# Altium footprint library Semicon-Discrete.pcblib: 205 footprints (part 6 of 13)
Each footprint in its own frame and in the unit in brackets; x right, y up, seen from the top. Pads: shape width x height; smd on the part's side, far side on the other; paste and mask are expansions set on the pad; w line width, h text height; cw(c..) or ccw(c..) is an arc to the next point about the centre after c.
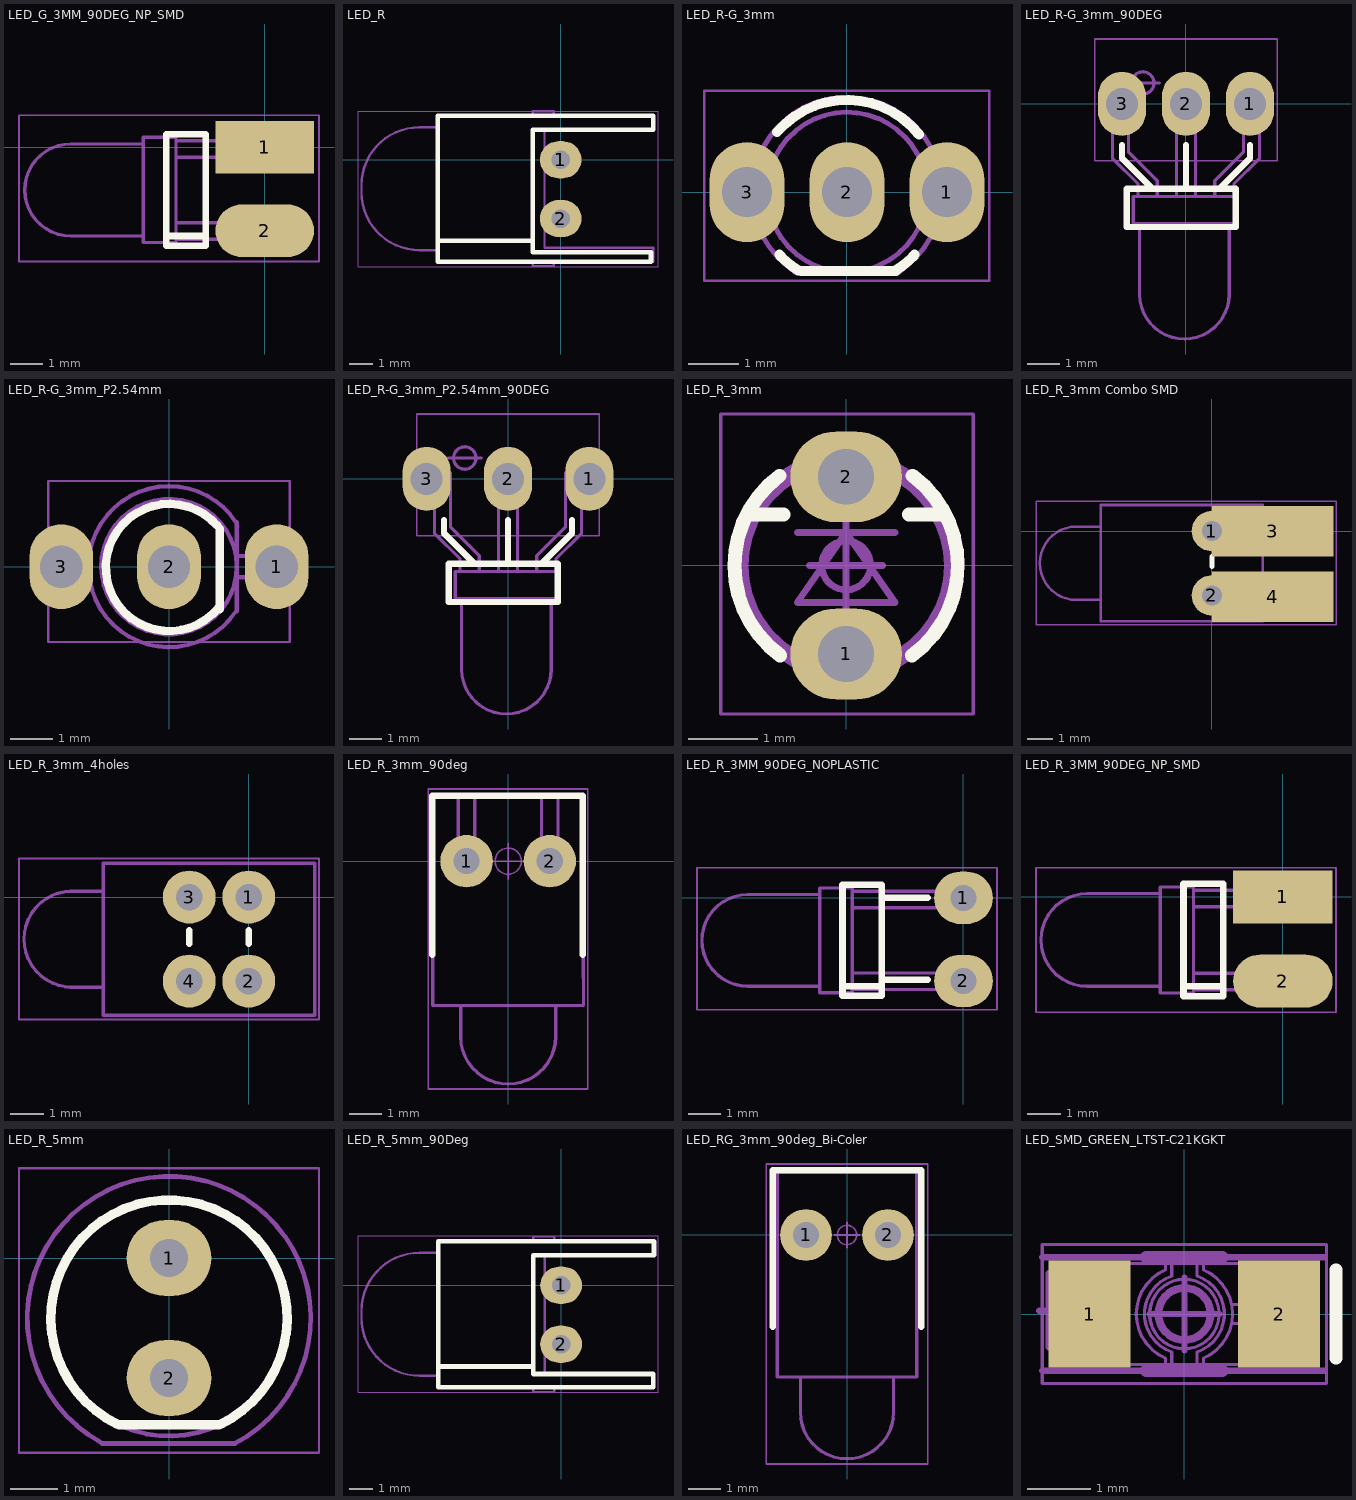
[diagram p5: the footprints below, top view; thin cyan lines are the x and y axes]

## LED_G_3MM_90DEG_NP_SMD [mm]
pads (2):
  rect 3x1.6 smd: 1(0,0)
  oval 3x1.6 smd: 2(0,-2.54)
TopOverlay:
  lines w0.2: -3,-2.7 -1.8,-2.7 ; -3,-3 -1.8,-3 -1.8,0 -1.8,0.4 -3,0.4 -3,-3
2-TopCompOutl:
  lines w0.1: -3.7,-2.7 -5.9,-2.7 cw(c-5.9,-1.3) -5.9,0.1 -3.7,0.1 -3.7,0.3 -2.7,0.3 -2.7,-2.9 -3.7,-2.9 -3.7,0.2 ; -2.7,-2.8 0.7,-2.8 0.7,-2.3 -2.7,-2.3 ; -2.7,-0.3 0.7,-0.3 0.7,0.2 -2.7,0.2
4-TopCourty:
  circle w0.1: c0,0 r0.325
  lines w0.05: -7.475,-3.475 1.65,-3.475 1.65,0.975 -7.475,0.975 -7.475,-3.475
  lines w0.1: -0.525,0 0.525,0 ; 0,-0.525 0,0.525
7-TopAssy:
  lines w0.1: -3.7,-2.7 -5.9,-2.7 cw(c-5.9,-1.3) -5.9,0.1 -3.7,0.1 -3.7,0.3 -2.7,0.3 -2.7,-2.9 -3.7,-2.9 -3.7,0.2 ; -2.7,-2.8 0.7,-2.8 0.7,-2.3 -2.7,-2.3 ; -2.7,-0.3 0.7,-0.3 0.7,0.2 -2.7,0.2
  text ".Designator" at -5.925,0.9 h2.2

## LED_R [mm]
pads (2):
  oval 1.8x1.6 hole 0.8: 1(0,0) 2(0,-2.54)
TopOverlay:
  lines w0.2: -5.3,-3.5 -1.2,-3.5 ; -5.3,-4.4 -5.3,1.9 -5.2,1.9 4,1.9 4,1.3 -1.2,1.3 -1.2,-4 3.9,-4 3.9,-4.4 -5.3,-4.4
2-TopCompOutl:
  lines w0.1: -8.6,-1.5 -8.6,-1 ; -8.6,-1.4 ccw(c-6.1,-1.4) -6.1,-3.9 -5.3,-3.9 ; -8.6,-1.1 cw(c-6.1,-1.1) -6.1,1.4 -5.3,1.4 ; -1.2,-4.4 -1.2,-4.6 -0.3,-4.6 -0.3,-4.4 ; -1.2,1.9 -1.2,2.1 -0.3,2.1 -0.3,1.9 ; -5.3,-4.4 4,-4.4 4,-3.8 -0.7,-3.8 -0.7,1.3 4,1.3 4,1.9 -5.3,1.9 -5.3,0 -5.3,-4.4
4-TopCourty:
  circle w0.1: c0,0 r0.35
  lines w0.05: -8.75,-4.625 4.2,-4.625 4.2,2.1 -8.75,2.1 -8.75,-4.625
  lines w0.1: -0.525,0 0.525,0 ; 0,-0.525 0,0.525
7-TopAssy:
  lines w0.1: -8.6,-1.5 -8.6,-1 ; -8.6,-1.4 ccw(c-6.1,-1.4) -6.1,-3.9 -5.3,-3.9 ; -8.6,-1.1 cw(c-6.1,-1.1) -6.1,1.4 -5.3,1.4 ; -1.2,-4.4 -1.2,-4.6 -0.3,-4.6 -0.3,-4.4 ; -1.2,1.9 -1.2,2.1 -0.3,2.1 -0.3,1.9 ; -5.3,-4.4 -5.3,0 -5.3,1.9 4,1.9 4,1.3 -0.7,1.3 -0.7,-3.8 4,-3.8 4,-4.4 -5.3,-4.4
  text ".Designator" at -6.25,2.525 h2.2

## LED_R-G_3mm [mm]
pads (3):
  oval 1.5x2 hole 1: 1(2,0) 2(0,0) 3(-2,0)
TopOverlay:
  lines w0.2: -1.4,1.2 cw(c0,0) 1.44,1.152 ; -1.355,-1.251 ccw(c0,0) -0.977,-1.564 ; -0.925,-1.575 0.975,-1.575 ; 0.977,-1.564 ccw(c0,0) 1.355,-1.251
2-TopCompOutl:
  lines w0.1: -1.9,-0.25 -2.25,-0.25 -2.25,0 -2.25,0.25 -1.9,0.25 ; -1.054,-1.581 cw(c0,0) 1.036,-1.592 ; -1.05,-1.6 1.05,-1.6 ; 0,-1.6 cw(c0,0) 0.028,-1.6 ; 1.9,-0.25 2.25,-0.25 2.25,0 2.25,0.25 1.9,0.25
4-TopCourty:
  circle w0.1: c0,0 r0.35
  lines w0.05: -2.85,-1.775 2.85,-1.775 2.85,2.025 -2.85,2.025 -2.85,-1.775
  lines w0.1: -0.525,0 0.525,0 ; 0,-0.525 0,0.525
7-TopAssy:
  lines w0.1: -1.9,-0.25 -2.25,-0.25 -2.25,0 -2.25,0.25 -1.9,0.25 ; -1.054,-1.581 cw(c0,0) 1.036,-1.592 ; -1.05,-1.6 1.05,-1.6 ; 0,-1.6 cw(c0,0) 0.028,-1.6 ; 1.9,-0.25 2.25,-0.25 2.25,0 2.25,0.25 1.9,0.25
  text ".Designator" at -1.375,2.225 h2.2
3D body "LED_R-G_3mm.STEP": height 9, standoff -2.2, extent -2.25,-1.55 2.25,1.9

## LED_R-G_3mm_90DEG [mm]
pads (3):
  oval 1.5x2 hole 1: 1(2,0) 2(0,0) 3(-2,0)
TopOverlay:
  lines w0.2: -2,-1.3 -2,-1.7 -1.1,-2.6 ; -1.45,-2.65 1.55,-2.65 1.55,-3.85 -1.85,-3.85 -1.85,-2.65 -1.4,-2.65 ; 0,-2.6 0,-1.3 ; 1.1,-2.6 2,-1.7 2,-1.3
2-TopCompOutl:
  lines w0.1: -1.55,-3.75 1.6,-3.75 1.6,-2.9 -1.65,-2.9 -1.65,-3.75 -1.45,-3.75 -1.45,-5.95 ccw(c-0.05,-5.95) 1.35,-5.95 1.35,-3.75 ; -1.5,-2.9 -1.5,-2.5 -2.3,-1.7 -2.3,0.2 -1.8,0.2 -1.8,-1.5 -0.9,-2.4 -0.9,-2.5 -0.9,-2.9 ; -0.3,-2.9 -0.3,0.2 0.3,0.2 0.3,-2.8 0.3,-2.9 ; 0.9,-2.9 0.9,-2.5 0.9,-2.4 1.8,-1.5 1.8,0.2 2.3,0.2 2.3,-1.7 1.5,-2.5 1.5,-2.9
4-TopCourty:
  circle w0.1: c-1.35,0.65 r0.35
  circle w0.1: c0,0 r0.35
  lines w0.05: -2.85,-1.775 -2.85,2.025 2.85,2.025 2.85,-1.775 -2.85,-1.775
  lines w0.1: -1.875,0.65 -0.825,0.65 ; -0.525,0 0.525,0 ; 0,-0.525 0,0.525
7-TopAssy:
  lines w0.1: -1.55,-3.75 1.6,-3.75 1.6,-2.9 -1.65,-2.9 -1.65,-3.75 -1.45,-3.75 -1.45,-5.95 ccw(c-0.05,-5.95) 1.35,-5.95 1.35,-3.75 ; -1.5,-2.9 -1.5,-2.5 -2.3,-1.7 -2.3,0.2 -1.8,0.2 -1.8,-1.5 -0.9,-2.4 -0.9,-2.5 -0.9,-2.9 ; -0.3,-2.9 -0.3,0.2 0.3,0.2 0.3,-2.8 0.3,-2.9 ; 0.9,-2.9 0.9,-2.5 0.9,-2.4 1.8,-1.5 1.8,0.2 2.3,0.2 2.3,-1.7 1.5,-2.5 1.5,-2.9
  text ".Designator" at 0.6,-7.1 h2.2
3D body "LED_R-G_3mm_90DEG.STEP": height 4.9, standoff -2, extent -2.25,-7.5 2.25,0.25

## LED_R-G_3mm_P2.54mm [mm]
pads (3):
  oval 1.5x2 hole 1: 1(2.54,0) 2(0,0) 3(-2.54,0)
TopOverlay:
  lines w0.2: 1.134,0.972 ccw(c0.009,-0.02) 1.168,-0.973 ; 1.2,-1 1.2,0.9
2-TopCompOutl:
  lines w0.1: -1.9,-0.25 -2.25,-0.25 -2.25,0 -2.25,0.25 -1.9,0.25 ; 1.581,-1.054 cw(c0,0) 1.592,1.036 ; 1.6,-1.05 1.6,1.05 ; 1.6,-0.225 1.6,-0.25 1.9,-0.25 2.25,-0.25 2.25,0 2.25,0.25 1.9,0.25 1.6,0.25 ; 1.6,0 cw(c0,0) 1.6,0.028
4-TopCourty:
  circle w0.1: c0,0 r0.35
  lines w0.05: -2.85,-1.775 -2.85,2.025 2.85,2.025 2.85,-1.775 -2.85,-1.775
  lines w0.1: -0.525,0 0.525,0 ; 0,-0.525 0,0.525
7-TopAssy:
  lines w0.1: -1.9,-0.25 -2.25,-0.25 -2.25,0 -2.25,0.25 -1.9,0.25 ; 1.581,-1.054 cw(c0,0) 1.592,1.036 ; 1.6,-1.05 1.6,1.05 ; 1.6,0 cw(c0,0) 1.6,0.028 ; 1.625,-0.25 1.9,-0.25 2.25,-0.25 2.25,0 2.25,0.25 1.9,0.25 1.625,0.25
  text ".Designator" at -1.375,2.225 h2.2
3D body "LED_R-G_3mm_P2.54mm.STEP": height 9, standoff -2.2, extent -2.79,-1.9 2.79,1.9

## LED_R-G_3mm_P2.54mm_90DEG [mm]
pads (3):
  oval 1.5x2 hole 1: 1(2.54,0) 2(0,0) 3(-2.54,0)
TopOverlay:
  lines w0.2: -2,-1.3 -2,-1.7 -1.1,-2.6 ; -1.45,-2.65 1.55,-2.65 1.55,-3.85 -1.85,-3.85 -1.85,-2.65 -1.4,-2.65 ; 0,-2.6 0,-1.3 ; 1.1,-2.6 2,-1.7 2,-1.3
2-TopCompOutl:
  lines w0.1: -1.55,-3.75 1.6,-3.75 1.6,-2.9 -1.65,-2.9 -1.65,-3.75 -1.45,-3.75 -1.45,-5.95 ccw(c-0.05,-5.95) 1.35,-5.95 1.35,-3.75 ; -1.5,-2.9 -1.5,-2.5 -2.3,-1.7 -2.3,0.2 -1.8,0.2 -1.8,-1.5 -0.9,-2.4 -0.9,-2.5 -0.9,-2.9 ; -0.3,-2.9 -0.3,0.2 0.3,0.2 0.3,-2.8 0.3,-2.9 ; 0.9,-2.9 0.9,-2.5 0.9,-2.4 1.8,-1.5 1.8,0.2 2.3,0.2 2.3,-1.7 1.5,-2.5 1.5,-2.9
4-TopCourty:
  circle w0.1: c0,0 r0.35
  circle w0.1: c-1.35,0.65 r0.35
  lines w0.05: -2.85,-1.775 2.85,-1.775 2.85,2.025 -2.85,2.025 -2.85,-1.775
  lines w0.1: -1.875,0.65 -0.825,0.65 ; -0.525,0 0.525,0 ; 0,-0.525 0,0.525
7-TopAssy:
  lines w0.1: -1.55,-3.75 1.6,-3.75 1.6,-2.9 -1.65,-2.9 -1.65,-3.75 -1.45,-3.75 -1.45,-5.95 ccw(c-0.05,-5.95) 1.35,-5.95 1.35,-3.75 ; -1.5,-2.9 -1.5,-2.5 -2.3,-1.7 -2.3,0.2 -1.8,0.2 -1.8,-1.5 -0.9,-2.4 -0.9,-2.5 -0.9,-2.9 ; -0.3,-2.9 -0.3,0.2 0.3,0.2 0.3,-2.8 0.3,-2.9 ; 0.9,-2.9 0.9,-2.5 0.9,-2.4 1.8,-1.5 1.8,0.2 2.3,0.2 2.3,-1.7 1.5,-2.5 1.5,-2.9
  text ".Designator" at 0.6,-7.1 h2.2
3D body "LED_R-G_3mm_P2.54mm_90DEG.STEP": height 8.15, standoff -2, extent -2.79,-7.5 2.79,0.25

## LED_R_3mm [mm]
pads (2):
  oval 1.6x1.3 hole 0.8: 1(0,-1.27) 2(0,1.27)
TopOverlay:
  lines w0.2: -1.4,0.73 -0.9,0.73 ; -0.954,1.285 ccw(c0,0) -0.945,-1.291 ; 0.9,0.73 1.4,0.73 ; 0.945,-1.291 ccw(c0,0) 0.954,1.285
2-TopCompOutl:
  lines w0.1: -0.528,-1.404 cw(c0,0) 0.528,-1.404 ; -0.525,-1.405 0.525,-1.405
4-TopCourty:
  circle w0.1: c0,0 r0.35
  lines w0.05: -1.8,-2.13 -1.8,2.17 1.825,2.17 1.825,-2.13 -1.8,-2.13
  lines w0.1: -0.525,0 0.525,0 ; 0,-0.525 0,0.525
5-MCadOutl:
  lines w0.05: -0.3,0 0,0 ; 0,-0.229 0,0 ; 0,0.254 0,0 ; 0.3,0 0,0
7-TopAssy:
  circle w0.1: c0,-0.005 r1.45
  lines w0.1: -0.7,0.47 0.7,0.47 ; -0.563,-1.498 cw(c0,0) 0.563,-1.498 ; -0.55,-1.505 0.55,-1.505 ; 0,-0.83 0,0.87 ; -0.7,-0.53 0.7,-0.53 0,0.47 -0.7,-0.53 ; -0.25,-1.53 0.25,-1.53 0.25,-1.03 -0.25,-1.03 -0.25,-1.53 ; -0.25,1.02 -0.25,1.52 0.25,1.52 0.25,1.02 -0.25,1.02
  text ".Designator" at -1.175,2.395 h2.2
3D body "LED_R_3mm.STEP": height 14.5, standoff -3.2, extent -1.596,-1.67 1.6,1.669

## LED_R_3mm Combo SMD [mm]
height 3
pads (4):
  round 1.6 hole 0.8: 1(0,0) 2(0,-2.54)
  rect 4.8x2 smd: 3(2.4,0) 4(2.4,-2.6)
TopOverlay:
  lines w0.2: 0,-1.4 0,-1
2-TopCompOutl:
  lines w0.1: -5.4,-2.72 -4.4,-2.72 ; -5.4,0.18 -4.4,0.18 ; -5.35,-2.72 cw(c-5.35,-1.27) -5.35,0.18 ; 2,-2.8 4.5,-2.8 4.5,-2.2 2,-2.2 ; 2,-0.3 4.5,-0.3 4.5,0.3 2,0.3 ; -4.4,-3.57 -4.4,1.03 2,1.03 2,-3.57 -4.4,-3.57
4-TopCourty:
  circle w0.1: c0,0 r0.4
  lines w0.05: -6.95,-3.7 4.9,-3.7 4.9,1.17 -6.95,1.17 -6.95,-3.7
  lines w0.1: -0.55,0 0.55,0 ; 0,-0.575 0,0.575
7-TopAssy:
  lines w0.1: -5.4,-2.72 -4.4,-2.72 ; -5.4,0.18 -4.4,0.18 ; -5.35,-2.72 cw(c-5.35,-1.27) -5.35,0.18 ; 2,-2.8 4.5,-2.8 4.5,-2.2 2,-2.2 ; 2,-0.3 4.5,-0.3 4.5,0.3 2,0.3 ; -4.4,-3.57 2,-3.57 2,1.03 -4.4,1.03 -4.4,-3.57
  text ".Designator" at -4.375,1.425 h2.2

## LED_R_3mm_4holes [mm]
pads (4):
  round 1.6 hole 0.8: 1(0,0) 2(0,-2.54) 3(-1.8,0) 4(-1.8,-2.54)
TopOverlay:
  lines w0.2: -1.8,-1.4 -1.8,-1 ; 0,-1.4 0,-1
2-TopCompOutl:
  lines w0.1: -5.4,-2.72 -4.4,-2.72 ; -5.4,0.18 -4.4,0.18 ; -5.35,-2.72 cw(c-5.35,-1.27) -5.35,0.18 ; -4.4,-3.57 2,-3.57 2,1.03 -4.4,1.03 -4.4,-3.57
4-TopCourty:
  circle w0.1: c0,0 r0.4
  lines w0.05: -6.95,-3.7 -6.95,1.17 2.125,1.17 2.125,-3.7 -6.95,-3.7
  lines w0.1: -0.55,0 0.55,0 ; 0,-0.575 0,0.575
7-TopAssy:
  lines w0.1: -5.4,-2.72 -4.4,-2.72 ; -5.4,0.18 -4.4,0.18 ; -5.35,-2.72 cw(c-5.35,-1.27) -5.35,0.18 ; -4.4,-3.57 -4.4,1.03 2,1.03 2,-3.57 -4.4,-3.57
  text ".Designator" at -5.05,1.625 h2.2

## LED_R_3mm_90deg [mm]
height 5.04
pads (2):
  round 1.6 hole 0.8: 1(-1.27,0) 2(1.27,0)
TopOverlay:
  lines w0.2: -2.32,-2.85 -2.32,2 2.28,2 2.28,-2.85
2-TopCompOutl:
  drawing of 295 lines, arcs and shapes, not listed
4-TopCourty:
  circle w0.05: c0,0 r0.4
  lines w0.05: -0.575,0 0.575,0 ; 0,-0.55 0,0.55 ; -2.44,-6.95 2.43,-6.95 2.43,2.2 -2.44,2.2 -2.44,-6.95
7-TopAssy:
  lines w0.1: -1.45,-5.4 -1.45,-4.4 ; -1.45,-5.35 ccw(c0,-5.35) 1.45,-5.35 ; 1.45,-5.4 1.45,-4.4 ; -2.3,-4.4 -2.3,2 2.3,2 2.3,-4.4 -2.3,-4.4
  text ".Designator" at 0.53,-3.45 h2.2
3D body "LED_R_3mm_90deg.STEP": height 7.3, standoff -3.5, extent -2.3,-6.8 2.3,1.95

## LED_R_3MM_90DEG_NOPLASTIC [mm]
pads (2):
  oval 1.8x1.6 hole 0.8: 1(0,0) 2(0,-2.54)
TopOverlay:
  lines w0.2: -3.7,-2.7 -2.5,-2.7 ; -2.5,-2.5 -1.1,-2.5 ; -1.1,0 -2.5,0 ; -2.5,0 -2.5,-3 -3.7,-3 -3.7,0.4 -2.5,0.4 -2.5,0
2-TopCompOutl:
  lines w0.1: -4.4,-2.7 -6.6,-2.7 cw(c-6.6,-1.3) -6.6,0.1 -4.4,0.1 -4.4,0.3 -3.4,0.3 -3.4,-2.9 -4.4,-2.9 -4.4,0.2 ; -3.4,-2.8 0,-2.8 0,-2.3 -3.4,-2.3 ; -3.4,-0.3 0,-0.3 0,0.2 -3.4,0.2
4-TopCourty:
  circle w0.1: c0,0 r0.4
  lines w0.05: -8.15,-3.425 1.025,-3.425 1.025,0.925 -8.15,0.925 -8.15,-3.425
  lines w0.1: -0.55,0 0.55,0 ; 0,-0.575 0,0.575
7-TopAssy:
  lines w0.1: -4.4,-2.7 -6.6,-2.7 cw(c-6.6,-1.3) -6.6,0.1 -4.4,0.1 -4.4,0.3 -3.4,0.3 -3.4,-2.9 -4.4,-2.9 -4.4,0.2 ; -3.4,-2.8 0,-2.8 0,-2.3 -3.4,-2.3 ; -3.4,-0.3 0,-0.3 0,0.2 -3.4,0.2
  text ".Designator" at -6.45,1.05 h2.2
3D body "LED_R_3MM_90DEG_NOPLASTIC.STEP": height 2, standoff -2.2, extent -7.9,-2.875 0.25,0.325

## LED_R_3MM_90DEG_NP_SMD [mm]
height 3
pads (2):
  rect 3x1.6 smd: 1(0,0)
  oval 3x1.6 smd: 2(0,-2.54)
TopOverlay:
  lines w0.2: -3,-2.7 -1.8,-2.7 ; -3,-3 -1.8,-3 -1.8,0 -1.8,0.4 -3,0.4 -3,-3
2-TopCompOutl:
  lines w0.1: -3.7,-2.7 -5.9,-2.7 cw(c-5.9,-1.3) -5.9,0.1 -3.7,0.1 -3.7,0.3 -2.7,0.3 -2.7,-2.9 -3.7,-2.9 -3.7,0.2 ; -2.7,-2.8 0.7,-2.8 0.7,-2.3 -2.7,-2.3 ; -2.7,-0.3 0.7,-0.3 0.7,0.2 -2.7,0.2
4-TopCourty:
  circle w0.1: c0,0 r0.4
  lines w0.05: -7.45,-3.475 -7.45,0.875 1.6,0.875 1.6,-3.475 -7.45,-3.475
  lines w0.1: -0.55,0 0.55,0 ; 0,-0.575 0,0.575
7-TopAssy:
  lines w0.1: -3.7,-2.7 -5.9,-2.7 cw(c-5.9,-1.3) -5.9,0.1 -3.7,0.1 -3.7,0.3 -2.7,0.3 -2.7,-2.9 -3.7,-2.9 -3.7,0.2 ; -2.7,-2.8 0.7,-2.8 0.7,-2.3 -2.7,-2.3 ; -2.7,-0.3 0.7,-0.3 0.7,0.2 -2.7,0.2
  text ".Designator" at -5.825,0.9 h2.2

## LED_R_5mm [mm]
pads (2):
  oval 1.8x1.6 hole 0.8: 1(0,0) 2(0,-2.54)
TopOverlay:
  lines w0.2: -1.087,-3.521 cw(c0,-1.27) 1.087,-3.521 ; -1.067,-3.531 1.067,-3.531
2-TopCompOutl:
  circle w0.1: c0,-1.27 r2.5
  lines w0.1: -1.454,-3.894 cw(c0,-1.27) 1.408,-3.919 ; -1.425,-3.925 1.4,-3.925
4-TopCourty:
  circle w0.1: c0,0 r0.4
  lines w0.05: -3.175,-4.125 3.175,-4.125 3.175,1.9 -3.175,1.9 -3.175,-4.125
  lines w0.1: -0.55,0 0.55,0 ; 0,-0.575 0,0.575
7-TopAssy:
  circle w0.1: c0,-1.27 r2.5
  lines w0.1: -1.454,-3.894 cw(c0,-1.27) 1.408,-3.919 ; -1.425,-3.925 1.4,-3.925
  text ".Designator" at -2.025,2.05 h2.2

## LED_R_5mm_90Deg [mm]
pads (2):
  oval 1.8x1.6 hole 0.8: 1(0,0) 2(0,-2.54)
TopOverlay:
  lines w0.2: -5.3,-3.5 -1.2,-3.5 ; -5.3,-4.4 3.975,-4.4 3.975,-3.825 -1.2,-3.825 -1.2,1.3 4,1.3 4,1.9 -5.2,1.9 -5.3,1.9 -5.3,-4.4
2-TopCompOutl:
  lines w0.1: -8.6,-1.5 -8.6,-1 ; -8.6,-1.4 ccw(c-6.1,-1.4) -6.1,-3.9 -5.3,-3.9 ; -8.6,-1.1 cw(c-6.1,-1.1) -6.1,1.4 -5.3,1.4 ; -1.2,-4.4 -1.2,-4.6 -0.3,-4.6 -0.3,-4.4 ; -1.2,1.9 -1.2,2.1 -0.3,2.1 -0.3,1.9 ; -5.3,-4.4 -5.3,0 -5.3,1.9 4,1.9 4,1.3 -0.7,1.3 -0.7,-3.8 4,-3.8 4,-4.4 -5.3,-4.4
4-TopCourty:
  circle w0.1: c0,0 r0.4
  lines w0.05: -8.75,-4.6 4.175,-4.6 4.175,2.125 -8.75,2.125 -8.75,-4.6
  lines w0.1: -0.55,0 0.55,0 ; 0,-0.575 0,0.575
7-TopAssy:
  lines w0.1: -8.6,-1.5 -8.6,-1 ; -8.6,-1.4 ccw(c-6.1,-1.4) -6.1,-3.9 -5.3,-3.9 ; -8.6,-1.1 cw(c-6.1,-1.1) -6.1,1.4 -5.3,1.4 ; -1.2,-4.4 -1.2,-4.6 -0.3,-4.6 -0.3,-4.4 ; -1.2,1.9 -1.2,2.1 -0.3,2.1 -0.3,1.9 ; -5.3,-4.4 4,-4.4 4,-3.8 -0.7,-3.8 -0.7,1.3 4,1.3 4,1.9 -5.3,1.9 -5.3,0 -5.3,-4.4
  text ".Designator" at -5.65,2.625 h2.2

## LED_RG_3mm_90deg_Bi-Coler [mm]
height 5.08
pads (2):
  round 1.6 hole 0.8: 1(-1.27,0) 2(1.27,0)
TopOverlay:
  lines w0.2: -2.3,-2.85 -2.3,2 2.3,2 2.3,-2.85
2-TopCompOutl:
  lines w0.1: -1.445,-4.4 -1.445,-5.495 ccw(c0,-5.495) 0,-6.94 ccw(c0,-5.495) 1.445,-5.495 1.445,-4.4 ; -2.16,-4.4 2.16,-4.4 2.16,1.95 -2.16,1.95 -2.16,-4.4
4-TopCourty:
  circle w0.05: c0,0 r0.3
  lines w0.05: -0.4,0 0.4,0 ; 0,-0.4 0,0.4 ; -2.5,-7.1 2.5,-7.1 2.5,2.2 -2.5,2.2 -2.5,-7.1
7-TopAssy:
  lines w0.1: -1.445,-4.4 -1.445,-5.495 ccw(c0,-5.495) 0,-6.94 ccw(c0,-5.495) 1.445,-5.495 1.445,-4.4 ; -2.16,-4.4 -2.16,1.95 2.16,1.95 2.16,-4.4 -2.16,-4.4
  text ".Designator" at 0.6,-3.45 h2.2
3D body "LED_RG_3mm_90deg_Bi-Coler.STEP": height 7.11, standoff -2.99, extent -2.164,-6.941 2.156,1.949

## LED_SMD_GREEN_LTST-C21KGKT [mm] "SMT,LED,1206,GREEN,Lite-On Inc. LTST-C21KGKT"
height 1.1
pads (2):
  rect 1.3x1.7 smd: 1(-1.5,0) 2(1.5,0)
TopOverlay:
  lines w0.2: 2.4,-0.7 2.4,0.7
2-TopCompOutl:
  lines w0.05: -1.7,-0.4 -1.7,0.5 ; -1,-0.8 -1,-0.7 ; -1,-0.6 -1,-0.4 ; -1,-0.3 -1,-0.1 ; -1,0 -1,0.2 ; -1,0.3 -1,0.5 ; -1,0.6 -1,0.8 ; -0.3,-0.8 -0.3,-0.7 cw(c0,0) -0.3,0.7 -0.3,0.8 ; -0.2,-0.8 -0.2,-0.6 cw(c0,0) -0.2,0.6 -0.2,0.8 ; 0.2,-0.8 0.2,-0.6 ccw(c0,0) 0.2,0.6 0.2,0.8 ; 0.3,-0.8 0.3,-0.7 ccw(c0,0) 0.3,0.7 0.3,0.8 ; 0.75,-0.15 1,-0.15 ; 0.75,0.15 1,0.15 ; 1,-0.8 1,-0.7 ; 1,-0.6 1,-0.4 ; 1,-0.3 1,-0.1 ; 1,0 1,0.2 ; 1,0.3 1,0.5 ; 1,0.6 1,0.8 ; -2.05,-0.4 -1.7,0.05 -2.05,0.5 -2.05,0.05 -2.05,-0.4 ; -1.6,-0.8 0,-0.8 1.6,-0.8 1.6,0 1.6,0.8 0,0.8 -1.6,0.8 -1.6,0 -1.6,-0.8 ; 0,-0.55 ccw(c0,0) 0,0.55 ccw(c0,0) 0,-0.55 ; 0,-0.45 ccw(c0,0) 0,0.45 ccw(c0,0) 0,-0.45
4-TopCourty:
  circle w0.1: c0,0 r0.4
  lines w0.05: -2.25,-1.1 -2.25,1.1 2.25,1.1 2.25,-1.1 -2.25,-1.1
  lines w0.1: -0.55,0 0.55,0 ; 0,-0.575 0,0.575
7-TopAssy:
  lines w0.1: -2.3,0.05 -1.45,0.05 ; -2.25,-0.9 2.225,-0.9 ; -2.25,0.9 2.225,0.9 ; -1.65,-0.55 -1.65,0.65 ; -2.15,-0.529 -2.15,0.15 -2.15,0.643 -1.694,0.057 -2.15,-0.529
  text ".Designator" at -1.3,-0.4 h1.6
13-SMDTopOverlay:
  lines w0.2: -0.6,-0.9 0.6,-0.9 ; -0.6,0.9 0.6,0.9
3D body "LED_SMD_GREEN_LTST-C21KGKT.STEP": height 1.1, standoff 0, extent -1.61,-0.8 1.61,0.8